# Altium schematic symbol library Resistor - Current Sense.SchLib: 810 symbols (part 4 of 4)
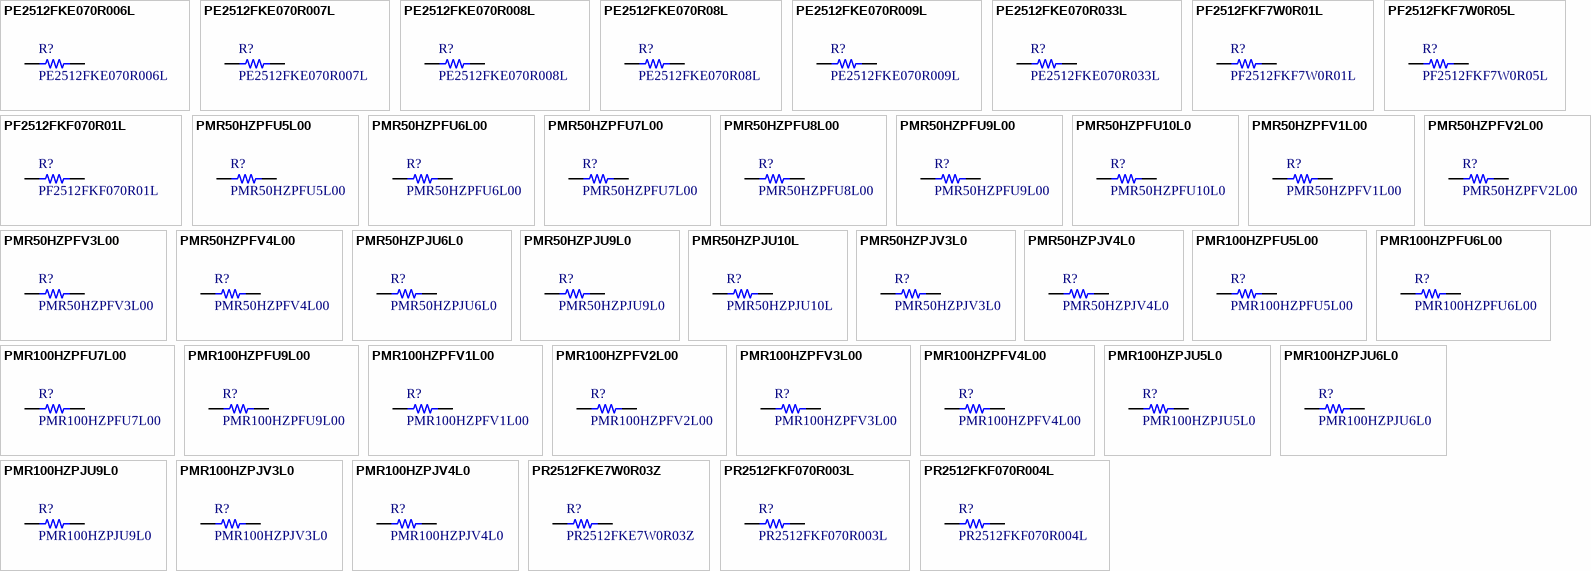
[diagram p23: symbols PE2512FKE070R006L to PR2512FKF070R004L]

## PMR50HZPFU8L00
designator R?
RES SMD 0.008 OHM 1% 1W 2010; Manufacturer: Rohm Semiconductor; Value: 0.008; TemperatureRange: -55C ~ 155C; TemperatureCoefficient: 100ppm/C; Part Number: PMR50HZPFU8L00; PartId: 21545; Supplier 1: Digi-Key; Supplier Part Number 1: RHM.008ASTR-ND; ComponentLink1Description: Datasheet; ComponentLink1URL: http://rohmfs.rohm.com/en/products/databook/datasheet/passive/resistor/chip_resistor/pmr.pdf; ComponentLink2Description: Digi-Key Listing; ComponentLink2URL: https://www.digikey.com/product-detail/en/rohm-semiconductor/PMR50HZPFU8L00/RHM.008ASTR-ND/1767323; Tolerance: 1%; PowerRating: 1W; Price: 0.1808; Device Package: 2010 (5025 Metric)
footprint STACKPOLE CSR2010
pins: 1, 2

## PMR50HZPFU9L00
designator R?
RES SMD 0.009 OHM 1% 1W 2010; Manufacturer: Rohm Semiconductor; Value: 0.009; TemperatureRange: -55C ~ 155C; TemperatureCoefficient: 100ppm/C; Part Number: PMR50HZPFU9L00; PartId: 21546; Supplier 1: Digi-Key; Supplier Part Number 1: RHM.009ASTR-ND; ComponentLink1Description: Datasheet; ComponentLink1URL: http://rohmfs.rohm.com/en/products/databook/datasheet/passive/resistor/chip_resistor/pmr.pdf; ComponentLink2Description: Digi-Key Listing; ComponentLink2URL: https://www.digikey.com/product-detail/en/rohm-semiconductor/PMR50HZPFU9L00/RHM.009ASTR-ND/1767324; Tolerance: 1%; PowerRating: 1W; Price: 0.1808; Device Package: 2010 (5025 Metric)
footprint STACKPOLE CSR2010
pins: 1, 2

## PMR50HZPFU10L0
designator R?
RES SMD 0.01 OHM 1% 1W 2010; Manufacturer: Rohm Semiconductor; Value: 0.01; TemperatureRange: -55C ~ 155C; TemperatureCoefficient: 100ppm/C; Part Number: PMR50HZPFU10L0; PartId: 21543; Supplier 1: Digi-Key; Supplier Part Number 1: RHM.010ASTR-ND; ComponentLink1Description: Datasheet; ComponentLink1URL: http://rohmfs.rohm.com/en/products/databook/datasheet/passive/resistor/chip_resistor/pmr.pdf; ComponentLink2Description: Digi-Key Listing; ComponentLink2URL: https://www.digikey.com/product-detail/en/rohm-semiconductor/PMR50HZPFU10L0/RHM.010ASTR-ND/1767325; Tolerance: 1%; PowerRating: 1W; Price: 0.1808; Device Package: 2010 (5025 Metric)
footprint STACKPOLE CSR2010
pins: 1, 2

## PMR50HZPFV1L00
designator R?
RES SMD 0.001 OHM 1% 1W 2010; Manufacturer: Rohm Semiconductor; Value: 0.001; TemperatureRange: -55C ~ 155C; TemperatureCoefficient: 100ppm/C; Part Number: PMR50HZPFV1L00; PartId: 21559; Supplier 1: Digi-Key; Supplier Part Number 1: RHM.001ASTR-ND; ComponentLink1Description: Datasheet; ComponentLink1URL: http://rohmfs.rohm.com/en/products/databook/datasheet/passive/resistor/chip_resistor/pmr.pdf; ComponentLink2Description: Digi-Key Listing; ComponentLink2URL: https://www.digikey.com/product-detail/en/rohm-semiconductor/PMR50HZPFV1L00/RHM.001ASTR-ND/1767316; Tolerance: 1%; PowerRating: 1W; Price: 0.1941; Device Package: 2010 (5025 Metric)
footprint STACKPOLE CSR2010
pins: 1, 2

## PMR50HZPFV2L00
designator R?
RES SMD 0.002 OHM 1% 1W 2010; Manufacturer: Rohm Semiconductor; Value: 0.002; TemperatureRange: -55C ~ 155C; TemperatureCoefficient: 100ppm/C; Part Number: PMR50HZPFV2L00; PartId: 21558; Supplier 1: Digi-Key; Supplier Part Number 1: RHM.002ASTR-ND; ComponentLink1Description: Datasheet; ComponentLink1URL: http://rohmfs.rohm.com/en/products/databook/datasheet/passive/resistor/chip_resistor/pmr.pdf; ComponentLink2Description: Digi-Key Listing; ComponentLink2URL: https://www.digikey.com/product-detail/en/rohm-semiconductor/PMR50HZPFV2L00/RHM.002ASTR-ND/1767317; Tolerance: 1%; PowerRating: 1W; Price: 0.1941; Device Package: 2010 (5025 Metric)
footprint STACKPOLE CSR2010
pins: 1, 2

## PMR50HZPFV3L00
designator R?
RES SMD 0.003 OHM 1% 1W 2010; Manufacturer: Rohm Semiconductor; Value: 0.003; TemperatureRange: -55C ~ 155C; TemperatureCoefficient: 100ppm/C; Part Number: PMR50HZPFV3L00; PartId: 21560; Supplier 1: Digi-Key; Supplier Part Number 1: RHM.003ASTR-ND; ComponentLink1Description: Datasheet; ComponentLink1URL: http://rohmfs.rohm.com/en/products/databook/datasheet/passive/resistor/chip_resistor/pmr.pdf; ComponentLink2Description: Digi-Key Listing; ComponentLink2URL: https://www.digikey.com/product-detail/en/rohm-semiconductor/PMR50HZPFV3L00/RHM.003ASTR-ND/1767318; Tolerance: 1%; PowerRating: 1W; Price: 0.1941; Device Package: 2010 (5025 Metric)
footprint STACKPOLE CSR2010
pins: 1, 2

## PMR50HZPFV4L00
designator R?
RES SMD 0.004 OHM 1% 1W 2010; Manufacturer: Rohm Semiconductor; Value: 0.004; TemperatureRange: -55C ~ 155C; TemperatureCoefficient: 100ppm/C; Part Number: PMR50HZPFV4L00; PartId: 21561; Supplier 1: Digi-Key; Supplier Part Number 1: RHM.004ASTR-ND; ComponentLink1Description: Datasheet; ComponentLink1URL: http://rohmfs.rohm.com/en/products/databook/datasheet/passive/resistor/chip_resistor/pmr.pdf; ComponentLink2Description: Digi-Key Listing; ComponentLink2URL: https://www.digikey.com/product-detail/en/rohm-semiconductor/PMR50HZPFV4L00/RHM.004ASTR-ND/1767319; Tolerance: 1%; PowerRating: 1W; Price: 0.1941; Device Package: 2010 (5025 Metric)
footprint STACKPOLE CSR2010
pins: 1, 2

## PMR50HZPJU6L0
designator R?
RES SMD 0.006 OHM 5% 1W 2010; Manufacturer: Rohm Semiconductor; Value: 0.006; TemperatureRange: -55C ~ 155C; TemperatureCoefficient: 100ppm/C; Part Number: PMR50HZPJU6L0; PartId: 21538; Supplier 1: Digi-Key; Supplier Part Number 1: RHM.006ATTR-ND; ComponentLink1Description: Datasheet; ComponentLink1URL: http://rohmfs.rohm.com/en/products/databook/datasheet/passive/resistor/chip_resistor/pmr.pdf; ComponentLink2Description: Digi-Key Listing; ComponentLink2URL: https://www.digikey.com/product-detail/en/rohm-semiconductor/PMR50HZPJU6L0/RHM.006ATTR-ND/1767311; Tolerance: 5%; PowerRating: 1W; Price: 0.1514; Device Package: 2010 (5025 Metric)
footprint STACKPOLE CSR2010
pins: 1, 2

## PMR50HZPJU9L0
designator R?
RES SMD 0.009 OHM 5% 1W 2010; Manufacturer: Rohm Semiconductor; Value: 0.009; TemperatureRange: -55C ~ 155C; TemperatureCoefficient: 100ppm/C; Part Number: PMR50HZPJU9L0; PartId: 21539; Supplier 1: Digi-Key; Supplier Part Number 1: RHM.009ATTR-ND; ComponentLink1Description: Datasheet; ComponentLink1URL: http://rohmfs.rohm.com/en/products/databook/datasheet/passive/resistor/chip_resistor/pmr.pdf; ComponentLink2Description: Digi-Key Listing; ComponentLink2URL: https://www.digikey.com/product-detail/en/rohm-semiconductor/PMR50HZPJU9L0/RHM.009ATTR-ND/1767314; Tolerance: 5%; PowerRating: 1W; Price: 0.1514; Device Package: 2010 (5025 Metric)
footprint STACKPOLE CSR2010
pins: 1, 2

## PMR50HZPJU10L
designator R?
RES SMD 0.01 OHM 5% 1W 2010; Manufacturer: Rohm Semiconductor; Value: 0.01; TemperatureRange: -55C ~ 155C; TemperatureCoefficient: 100ppm/C; Part Number: PMR50HZPJU10L; PartId: 21537; Supplier 1: Digi-Key; Supplier Part Number 1: RHM.010ATTR-ND; ComponentLink1Description: Datasheet; ComponentLink1URL: http://rohmfs.rohm.com/en/products/databook/datasheet/passive/resistor/chip_resistor/pmr.pdf; ComponentLink2Description: Digi-Key Listing; ComponentLink2URL: https://www.digikey.com/product-detail/en/rohm-semiconductor/PMR50HZPJU10L/RHM.010ATTR-ND/1767315; Tolerance: 5%; PowerRating: 1W; Price: 0.1514; Device Package: 2010 (5025 Metric)
footprint STACKPOLE CSR2010
pins: 1, 2

## PMR50HZPJV3L0
designator R?
RES SMD 0.003 OHM 5% 1W 2010; Manufacturer: Rohm Semiconductor; Value: 0.003; TemperatureRange: -55C ~ 155C; TemperatureCoefficient: 100ppm/C; Part Number: PMR50HZPJV3L0; PartId: 21540; Supplier 1: Digi-Key; Supplier Part Number 1: RHM.003ATTR-ND; ComponentLink1Description: Datasheet; ComponentLink1URL: http://rohmfs.rohm.com/en/products/databook/datasheet/passive/resistor/chip_resistor/pmr.pdf; ComponentLink2Description: Digi-Key Listing; ComponentLink2URL: https://www.digikey.com/product-detail/en/rohm-semiconductor/PMR50HZPJV3L0/RHM.003ATTR-ND/1767308; Tolerance: 5%; PowerRating: 1W; Price: 0.1634; Device Package: 2010 (5025 Metric)
footprint STACKPOLE CSR2010
pins: 1, 2

## PMR50HZPJV4L0
designator R?
RES SMD 0.004 OHM 5% 1W 2010; Manufacturer: Rohm Semiconductor; Value: 0.004; TemperatureRange: -55C ~ 155C; TemperatureCoefficient: 100ppm/C; Part Number: PMR50HZPJV4L0; PartId: 21541; Supplier 1: Digi-Key; Supplier Part Number 1: RHM.004ATTR-ND; ComponentLink1Description: Datasheet; ComponentLink1URL: http://rohmfs.rohm.com/en/products/databook/datasheet/passive/resistor/chip_resistor/pmr.pdf; ComponentLink2Description: Digi-Key Listing; ComponentLink2URL: https://www.digikey.com/product-detail/en/rohm-semiconductor/PMR50HZPJV4L0/RHM.004ATTR-ND/1767309; Tolerance: 5%; PowerRating: 1W; Price: 0.1634; Device Package: 2010 (5025 Metric)
footprint STACKPOLE CSR2010
pins: 1, 2

## PMR100HZPFU5L00
designator R?
RES SMD 0.005 OHM 1% 2W 2512; Manufacturer: Rohm Semiconductor; Value: 0.005; TemperatureRange: -55C ~ 155C; TemperatureCoefficient: 100ppm/C; Part Number: PMR100HZPFU5L00; PartId: 21331; Supplier 1: Digi-Key; Supplier Part Number 1: RHM.005AUTR-ND; ComponentLink1Description: Datasheet; ComponentLink1URL: http://rohmfs.rohm.com/en/products/databook/datasheet/passive/resistor/chip_resistor/pmr.pdf; ComponentLink2Description: Digi-Key Listing; ComponentLink2URL: https://www.digikey.com/product-detail/en/rohm-semiconductor/PMR100HZPFU5L00/RHM.005AUTR-ND/1767340; Tolerance: 1%; PowerRating: 2W; Price: 0.1634; Device Package: 2512 (6432 Metric)
footprint STACKPOLE CSR2512
pins: 1, 2

## PMR100HZPFU6L00
designator R?
RES SMD 0.006 OHM 1% 2W 2512; Manufacturer: Rohm Semiconductor; Value: 0.006; TemperatureRange: -55C ~ 155C; TemperatureCoefficient: 100ppm/C; Part Number: PMR100HZPFU6L00; PartId: 21332; Supplier 1: Digi-Key; Supplier Part Number 1: RHM.006AUTR-ND; ComponentLink1Description: Datasheet; ComponentLink1URL: http://rohmfs.rohm.com/en/products/databook/datasheet/passive/resistor/chip_resistor/pmr.pdf; ComponentLink2Description: Digi-Key Listing; ComponentLink2URL: https://www.digikey.com/product-detail/en/rohm-semiconductor/PMR100HZPFU6L00/RHM.006AUTR-ND/1767341; Tolerance: 1%; PowerRating: 2W; Price: 0.1634; Device Package: 2512 (6432 Metric)
footprint STACKPOLE CSR2512
pins: 1, 2

## PMR100HZPFU7L00
designator R?
RES SMD 0.007 OHM 1% 2W 2512; Manufacturer: Rohm Semiconductor; Value: 0.007; TemperatureRange: -55C ~ 155C; TemperatureCoefficient: 100ppm/C; Part Number: PMR100HZPFU7L00; PartId: 21335; Supplier 1: Digi-Key; Supplier Part Number 1: RHM.007AUTR-ND; ComponentLink1Description: Datasheet; ComponentLink1URL: http://rohmfs.rohm.com/en/products/databook/datasheet/passive/resistor/chip_resistor/pmr.pdf; ComponentLink2Description: Digi-Key Listing; ComponentLink2URL: https://www.digikey.com/product-detail/en/rohm-semiconductor/PMR100HZPFU7L00/RHM.007AUTR-ND/1767342; Tolerance: 1%; PowerRating: 2W; Price: 0.1634; Device Package: 2512 (6432 Metric)
footprint STACKPOLE CSR2512
pins: 1, 2

## PMR100HZPFU9L00
designator R?
RES SMD 0.009 OHM 1% 2W 2512; Manufacturer: Rohm Semiconductor; Value: 0.009; TemperatureRange: -55C ~ 155C; TemperatureCoefficient: 100ppm/C; Part Number: PMR100HZPFU9L00; PartId: 21336; Supplier 1: Digi-Key; Supplier Part Number 1: RHM.009AUTR-ND; ComponentLink1Description: Datasheet; ComponentLink1URL: http://rohmfs.rohm.com/en/products/databook/datasheet/passive/resistor/chip_resistor/pmr.pdf; ComponentLink2Description: Digi-Key Listing; ComponentLink2URL: https://www.digikey.com/product-detail/en/rohm-semiconductor/PMR100HZPFU9L00/RHM.009AUTR-ND/1767344; Tolerance: 1%; PowerRating: 2W; Price: 0.1634; Device Package: 2512 (6432 Metric)
footprint STACKPOLE CSR2512
pins: 1, 2

## PMR100HZPFV1L00
designator R?
RES SMD 0.001 OHM 1% 2W 2512; Manufacturer: Rohm Semiconductor; Value: 0.001; TemperatureRange: -55C ~ 155C; TemperatureCoefficient: 150ppm/C; Part Number: PMR100HZPFV1L00; PartId: 21330; Supplier 1: Digi-Key; Supplier Part Number 1: RHM.001AUTR-ND; ComponentLink1Description: Datasheet; ComponentLink1URL: http://rohmfs.rohm.com/en/products/databook/datasheet/passive/resistor/chip_resistor/pmr.pdf; ComponentLink2Description: Digi-Key Listing; ComponentLink2URL: https://www.digikey.com/product-detail/en/rohm-semiconductor/PMR100HZPFV1L00/RHM.001AUTR-ND/1767336; Tolerance: 1%; PowerRating: 2W; Price: 0.1634; Device Package: 2512 (6432 Metric)
footprint STACKPOLE CSR2512
pins: 1, 2

## PMR100HZPFV2L00
designator R?
RES SMD 0.002 OHM 1% 2W 2512; Manufacturer: Rohm Semiconductor; Value: 0.002; TemperatureRange: -55C ~ 155C; TemperatureCoefficient: 150ppm/C; Part Number: PMR100HZPFV2L00; PartId: 21333; Supplier 1: Digi-Key; Supplier Part Number 1: RHM.002AUTR-ND; ComponentLink1Description: Datasheet; ComponentLink1URL: http://rohmfs.rohm.com/en/products/databook/datasheet/passive/resistor/chip_resistor/pmr.pdf; ComponentLink2Description: Digi-Key Listing; ComponentLink2URL: https://www.digikey.com/product-detail/en/rohm-semiconductor/PMR100HZPFV2L00/RHM.002AUTR-ND/1767337; Tolerance: 1%; PowerRating: 2W; Price: 0.1634; Device Package: 2512 (6432 Metric)
footprint STACKPOLE CSR2512
pins: 1, 2

## PMR100HZPFV3L00
designator R?
RES SMD 0.003 OHM 1% 2W 2512; Manufacturer: Rohm Semiconductor; Value: 0.003; TemperatureRange: -55C ~ 155C; TemperatureCoefficient: 100ppm/C; Part Number: PMR100HZPFV3L00; PartId: 21334; Supplier 1: Digi-Key; Supplier Part Number 1: RHM.003AUTR-ND; ComponentLink1Description: Datasheet; ComponentLink1URL: http://rohmfs.rohm.com/en/products/databook/datasheet/passive/resistor/chip_resistor/pmr.pdf; ComponentLink2Description: Digi-Key Listing; ComponentLink2URL: https://www.digikey.com/product-detail/en/rohm-semiconductor/PMR100HZPFV3L00/RHM.003AUTR-ND/1767338; Tolerance: 1%; PowerRating: 2W; Price: 0.1634; Device Package: 2512 (6432 Metric)
footprint STACKPOLE CSR2512
pins: 1, 2

## PMR100HZPFV4L00
designator R?
RES SMD 0.004 OHM 1% 2W 2512; Manufacturer: Rohm Semiconductor; Value: 0.004; TemperatureRange: -55C ~ 155C; TemperatureCoefficient: 100ppm/C; Part Number: PMR100HZPFV4L00; PartId: 21337; Supplier 1: Digi-Key; Supplier Part Number 1: RHM.004AUTR-ND; ComponentLink1Description: Datasheet; ComponentLink1URL: http://rohmfs.rohm.com/en/products/databook/datasheet/passive/resistor/chip_resistor/pmr.pdf; ComponentLink2Description: Digi-Key Listing; ComponentLink2URL: https://www.digikey.com/product-detail/en/rohm-semiconductor/PMR100HZPFV4L00/RHM.004AUTR-ND/1767339; Tolerance: 1%; PowerRating: 2W; Price: 0.1634; Device Package: 2512 (6432 Metric)
footprint STACKPOLE CSR2512
pins: 1, 2

## PMR100HZPJU5L0
designator R?
RES SMD 0.005 OHM 5% 2W 2512; Manufacturer: Rohm Semiconductor; Value: 0.005; TemperatureRange: -55C ~ 155C; TemperatureCoefficient: 100ppm/C; Part Number: PMR100HZPJU5L0; PartId: 21307; Supplier 1: Digi-Key; Supplier Part Number 1: RHM.005AVTR-ND; ComponentLink1Description: Datasheet; ComponentLink1URL: http://rohmfs.rohm.com/en/products/databook/datasheet/passive/resistor/chip_resistor/pmr.pdf; ComponentLink2Description: Digi-Key Listing; ComponentLink2URL: https://www.digikey.com/product-detail/en/rohm-semiconductor/PMR100HZPJU5L0/RHM.005AVTR-ND/1767330; Tolerance: 5%; PowerRating: 2W; Price: 0.1514; Device Package: 2512 (6432 Metric)
footprint STACKPOLE CSR2512
pins: 1, 2

## PMR100HZPJU6L0
designator R?
RES SMD 0.006 OHM 5% 2W 2512; Manufacturer: Rohm Semiconductor; Value: 0.006; TemperatureRange: -55C ~ 155C; TemperatureCoefficient: 100ppm/C; Part Number: PMR100HZPJU6L0; PartId: 21308; Supplier 1: Digi-Key; Supplier Part Number 1: RHM.006AVTR-ND; ComponentLink1Description: Datasheet; ComponentLink1URL: http://rohmfs.rohm.com/en/products/databook/datasheet/passive/resistor/chip_resistor/pmr.pdf; ComponentLink2Description: Digi-Key Listing; ComponentLink2URL: https://www.digikey.com/product-detail/en/rohm-semiconductor/PMR100HZPJU6L0/RHM.006AVTR-ND/1767331; Tolerance: 5%; PowerRating: 2W; Price: 0.1514; Device Package: 2512 (6432 Metric)
footprint STACKPOLE CSR2512
pins: 1, 2

## PMR100HZPJU9L0
designator R?
RES SMD 0.009 OHM 5% 2W 2512; Manufacturer: Rohm Semiconductor; Value: 0.009; TemperatureRange: -55C ~ 155C; TemperatureCoefficient: 100ppm/C; Part Number: PMR100HZPJU9L0; PartId: 21309; Supplier 1: Digi-Key; Supplier Part Number 1: RHM.009AVTR-ND; ComponentLink1Description: Datasheet; ComponentLink1URL: http://rohmfs.rohm.com/en/products/databook/datasheet/passive/resistor/chip_resistor/pmr.pdf; ComponentLink2Description: Digi-Key Listing; ComponentLink2URL: https://www.digikey.com/product-detail/en/rohm-semiconductor/PMR100HZPJU9L0/RHM.009AVTR-ND/1767334; Tolerance: 5%; PowerRating: 2W; Price: 0.1514; Device Package: 2512 (6432 Metric)
footprint STACKPOLE CSR2512
pins: 1, 2

## PMR100HZPJV3L0
designator R?
RES SMD 0.003 OHM 5% 2W 2512; Manufacturer: Rohm Semiconductor; Value: 0.003; TemperatureRange: -55C ~ 155C; TemperatureCoefficient: 100ppm/C; Part Number: PMR100HZPJV3L0; PartId: 21391; Supplier 1: Digi-Key; Supplier Part Number 1: RHM.003AVTR-ND; ComponentLink1Description: Datasheet; ComponentLink1URL: http://rohmfs.rohm.com/en/products/databook/datasheet/passive/resistor/chip_resistor/pmr.pdf; ComponentLink2Description: Digi-Key Listing; ComponentLink2URL: https://www.digikey.com/product-detail/en/rohm-semiconductor/PMR100HZPJV3L0/RHM.003AVTR-ND/1767328; Tolerance: 5%; PowerRating: 2W; Price: 0.1782; Device Package: 2512 (6432 Metric)
footprint STACKPOLE CSR2512
pins: 1, 2

## PMR100HZPJV4L0
designator R?
RES SMD 0.004 OHM 5% 2W 2512; Manufacturer: Rohm Semiconductor; Value: 0.004; TemperatureRange: -55C ~ 155C; TemperatureCoefficient: 100ppm/C; Part Number: PMR100HZPJV4L0; PartId: 21392; Supplier 1: Digi-Key; Supplier Part Number 1: RHM.004AVTR-ND; ComponentLink1Description: Datasheet; ComponentLink1URL: http://rohmfs.rohm.com/en/products/databook/datasheet/passive/resistor/chip_resistor/pmr.pdf; ComponentLink2Description: Digi-Key Listing; ComponentLink2URL: https://www.digikey.com/product-detail/en/rohm-semiconductor/PMR100HZPJV4L0/RHM.004AVTR-ND/1767329; Tolerance: 5%; PowerRating: 2W; Price: 0.1782; Device Package: 2512 (6432 Metric)
footprint STACKPOLE CSR2512
pins: 1, 2

## PR2512FKE7W0R03Z
designator R?
RES SMD 0.03 OHM 1% 2W 2512; Manufacturer: Yageo; Value: 0.03; TemperatureRange: -55C ~ 170C; TemperatureCoefficient: 50ppm/C; Part Number: PR2512FKE7W0R03Z; PartId: 21440; Supplier 1: Digi-Key; Supplier Part Number 1: 311-0.03PDTR-ND; ComponentLink1Description: Datasheet; ComponentLink1URL: http://www.yageo.com/NewPortal/yageodocoutput?fileName=/pdf/R-Chip/-PYu-PR_51_RoHS_Z_0.pdf; ComponentLink2Description: Digi-Key Listing; ComponentLink2URL: https://www.digikey.com/product-detail/en/yageo/PR2512FKE7W0R03Z/311-0.03PDTR-ND/2827693; Tolerance: 1%; PowerRating: 2W; Price: 0.272; Device Package: 2512 (6432 Metric)
footprint STACKPOLE CSR2512
pins: 1, 2

## PR2512FKF070R003L
designator R?
RES SMD 0.003 OHM 1% 1W 2512; Manufacturer: Yageo; Value: 0.003; TemperatureRange: -55C ~ 170C; TemperatureCoefficient: 100ppm/C; Part Number: PR2512FKF070R003L; PartId: 21401; Supplier 1: Digi-Key; Supplier Part Number 1: 311-0.003AGTR-ND; ComponentLink1Description: Datasheet; ComponentLink1URL: http://www.yageo.com/NewPortal/yageodocoutput?fileName=/pdf/R-Chip/-PYu-PR_51_RoHS_Z_0.pdf; ComponentLink2Description: Digi-Key Listing; ComponentLink2URL: https://www.digikey.com/product-detail/en/yageo/PR2512FKF070R003L/311-0.003AGTR-ND/2178317; Tolerance: 1%; PowerRating: 1W; Price: 0.1882; Device Package: 2512 (6432 Metric)
footprint STACKPOLE CSR2512
pins: 1, 2

## PR2512FKF070R004L
designator R?
RES SMD 0.004 OHM 1% 1W 2512; Manufacturer: Yageo; Value: 0.004; TemperatureRange: -55C ~ 170C; TemperatureCoefficient: 100ppm/C; Part Number: PR2512FKF070R004L; PartId: 21403; Supplier 1: Digi-Key; Supplier Part Number 1: 311-0.004AGTR-ND; ComponentLink1Description: Datasheet; ComponentLink1URL: http://www.yageo.com/NewPortal/yageodocoutput?fileName=/pdf/R-Chip/-PYu-PR_51_RoHS_Z_0.pdf; ComponentLink2Description: Digi-Key Listing; ComponentLink2URL: https://www.digikey.com/product-detail/en/yageo/PR2512FKF070R004L/311-0.004AGTR-ND/2178316; Tolerance: 1%; PowerRating: 1W; Price: 0.1882; Device Package: 2512 (6432 Metric)
footprint STACKPOLE CSR2512
pins: 1, 2

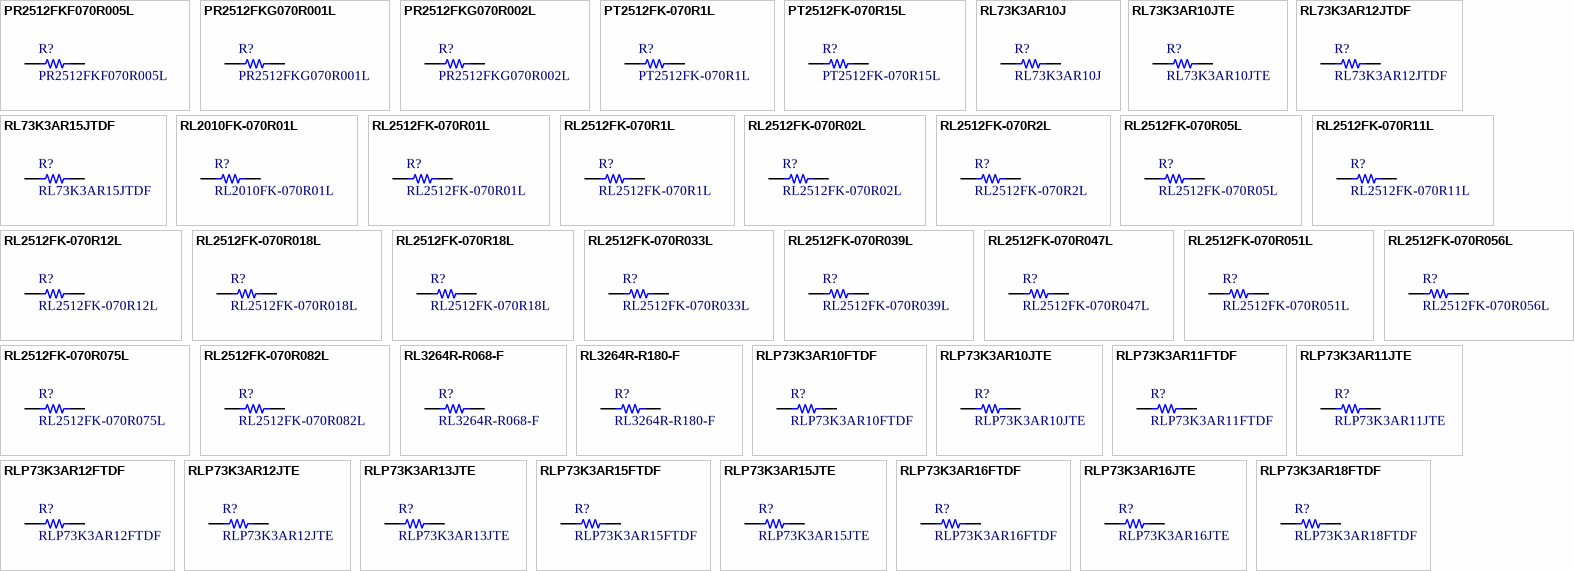
[diagram p16: symbols PR2512FKF070R005L to RLP73K3AR18FTDF]

## PR2512FKF070R005L
designator R?
RES SMD 0.005 OHM 1% 1W 2512; Manufacturer: Yageo; Value: 0.005; TemperatureRange: -55C ~ 170C; TemperatureCoefficient: 100ppm/C; Part Number: PR2512FKF070R005L; PartId: 21402; Supplier 1: Digi-Key; Supplier Part Number 1: 311-0.005AGTR-ND; ComponentLink1Description: Datasheet; ComponentLink1URL: http://www.yageo.com/NewPortal/yageodocoutput?fileName=/pdf/R-Chip/-PYu-PR_51_RoHS_Z_0.pdf; ComponentLink2Description: Digi-Key Listing; ComponentLink2URL: https://www.digikey.com/product-detail/en/yageo/PR2512FKF070R005L/311-0.005AGTR-ND/2178315; Tolerance: 1%; PowerRating: 1W; Price: 0.1882; Device Package: 2512 (6432 Metric)
footprint STACKPOLE CSR2512
pins: 1, 2

## PR2512FKG070R001L
designator R?
RES SMD 0.001 OHM 1% 1W 2512; Manufacturer: Yageo; Value: 0.001; TemperatureRange: -55C ~ 170C; TemperatureCoefficient: 200ppm/C; Part Number: PR2512FKG070R001L; PartId: 21438; Supplier 1: Digi-Key; Supplier Part Number 1: 311-0.001AGTR-ND; ComponentLink1Description: Datasheet; ComponentLink1URL: http://www.yageo.com/NewPortal/yageodocoutput?fileName=/pdf/R-Chip/-PYu-PR_51_RoHS_Z_0.pdf; ComponentLink2Description: Digi-Key Listing; ComponentLink2URL: https://www.digikey.com/product-detail/en/yageo/PR2512FKG070R001L/311-0.001AGTR-ND/2178319; Tolerance: 1%; PowerRating: 1W; Price: 0.272; Device Package: 2512 (6432 Metric)
footprint STACKPOLE CSR2512
pins: 1, 2

## PR2512FKG070R002L
designator R?
RES SMD 0.002 OHM 1% 1W 2512; Manufacturer: Yageo; Value: 0.002; TemperatureRange: -55C ~ 170C; TemperatureCoefficient: 200ppm/C; Part Number: PR2512FKG070R002L; PartId: 21439; Supplier 1: Digi-Key; Supplier Part Number 1: 311-0.002AGTR-ND; ComponentLink1Description: Datasheet; ComponentLink1URL: http://www.yageo.com/NewPortal/yageodocoutput?fileName=/pdf/R-Chip/-PYu-PR_51_RoHS_Z_0.pdf; ComponentLink2Description: Digi-Key Listing; ComponentLink2URL: https://www.digikey.com/product-detail/en/yageo/PR2512FKG070R002L/311-0.002AGTR-ND/2178318; Tolerance: 1%; PowerRating: 1W; Price: 0.272; Device Package: 2512 (6432 Metric)
footprint STACKPOLE CSR2512
pins: 1, 2

## PT2512FK-070R1L
designator R?
RES SMD 0.1 OHM 1% 1W 2512; Manufacturer: Yageo; Value: 0.1; TemperatureRange: -55C ~ 155C; TemperatureCoefficient: 100ppm/C; Part Number: PT2512FK-070R1L; PartId: 21227; Supplier 1: Digi-Key; Supplier Part Number 1: 311-0.1ARTR-ND; ComponentLink1Description: Datasheet; ComponentLink1URL: http://www.yageo.com/documents/recent/PYu-PT-Group_521_RoHS_L-1.pdf; ComponentLink2Description: Digi-Key Listing; ComponentLink2URL: https://www.digikey.com/product-detail/en/yageo/PT2512FK-070R1L/311-0.1ARTR-ND/2178346; Tolerance: 1%; PowerRating: 1W; Price: 0.1004; Device Package: 2512 (6432 Metric)
footprint STACKPOLE CSR2512
pins: 1, 2

## PT2512FK-070R15L
designator R?
RES SMD 0.15 OHM 1% 1W 2512; Manufacturer: Yageo; Value: 0.15; TemperatureRange: -55C ~ 155C; TemperatureCoefficient: 75ppm/C; Part Number: PT2512FK-070R15L; PartId: 21217; Supplier 1: Digi-Key; Supplier Part Number 1: 311-0.15ARTR-ND; ComponentLink1Description: Datasheet; ComponentLink1URL: http://www.yageo.com/documents/recent/PYu-PT-Group_521_RoHS_L-1.pdf; ComponentLink2Description: Digi-Key Listing; ComponentLink2URL: https://www.digikey.com/product-detail/en/yageo/PT2512FK-070R15L/311-0.15ARTR-ND/2178347; Tolerance: 1%; PowerRating: 1W; Price: 0.096; Device Package: 2512 (6432 Metric)
footprint STACKPOLE CSR2512
pins: 1, 2

## RL73K3AR10J
designator R?
RES SMD 0.1 OHM 5% 1W 2512; Value: 0.1; TemperatureRange: -55C ~ 155C; TemperatureCoefficient: 200ppm/C; Part Number: RL73K3AR10J; PartId: 21212; Supplier 1: Digi-Key; Supplier Part Number 1: A103652TR-ND; ComponentLink1Description: Datasheet; ComponentLink1URL: http://www.te.com/commerce/DocumentDelivery/DDEController?Action=srchrtrv&DocNm=1773269&DocType=DS&DocLang=English; ComponentLink2Description: Digi-Key Listing; ComponentLink2URL: https://www.digikey.com/product-detail/en/te-connectivity-passive-product/RL73K3AR10J/A103652TR-ND/2055681; Tolerance: 5%; PowerRating: 1W; Price: 0.0813; Device Package: 2512 (6432 Metric)
footprint STACKPOLE CSR2512
pins: 1, 2

## RL73K3AR10JTE
designator R?
RES SMD 0.1 OHM 5% 1W 2512; Value: 0.1; TemperatureRange: -55C ~ 155C; TemperatureCoefficient: 200ppm/C; Part Number: RL73K3AR10JTE; PartId: 21211; Supplier 1: Digi-Key; Supplier Part Number 1: A103653TR-ND; ComponentLink1Description: Datasheet; ComponentLink1URL: http://www.te.com/commerce/DocumentDelivery/DDEController?Action=srchrtrv&DocNm=1773269&DocType=DS&DocLang=English; ComponentLink2Description: Digi-Key Listing; ComponentLink2URL: https://www.digikey.com/product-detail/en/te-connectivity-passive-product/RL73K3AR10JTE/A103653TR-ND/2055682; Tolerance: 5%; PowerRating: 1W; Price: 0.0813; Device Package: 2512 (6432 Metric)
footprint STACKPOLE CSR2512
pins: 1, 2

## RL73K3AR12JTDF
designator R?
RES SMD 0.12 OHM 5% 1W 2512; Value: 0.12; TemperatureRange: -55C ~ 155C; TemperatureCoefficient: 200ppm/C; Part Number: RL73K3AR12JTDF; PartId: 21241; Supplier 1: Digi-Key; Supplier Part Number 1: A106123TR-ND; ComponentLink1Description: Datasheet; ComponentLink1URL: http://www.te.com/commerce/DocumentDelivery/DDEController?Action=srchrtrv&DocNm=1773269&DocType=DS&DocLang=English; ComponentLink2Description: Digi-Key Listing; ComponentLink2URL: https://www.digikey.com/product-detail/en/te-connectivity-passive-product/RL73K3AR12JTDF/A106123TR-ND/2364959; Tolerance: 5%; PowerRating: 1W; Price: 0.1111; Device Package: 2512 (6432 Metric)
footprint STACKPOLE CSR2512
pins: 1, 2

## RL73K3AR15JTDF
designator R?
RES SMD 0.15 OHM 5% 1W 2512; Value: 0.15; TemperatureRange: -55C ~ 155C; TemperatureCoefficient: 200ppm/C; Part Number: RL73K3AR15JTDF; PartId: 21240; Supplier 1: Digi-Key; Supplier Part Number 1: A106124TR-ND; ComponentLink1Description: Datasheet; ComponentLink1URL: http://www.te.com/commerce/DocumentDelivery/DDEController?Action=srchrtrv&DocNm=1773269&DocType=DS&DocLang=English; ComponentLink2Description: Digi-Key Listing; ComponentLink2URL: https://www.digikey.com/product-detail/en/te-connectivity-passive-product/RL73K3AR15JTDF/A106124TR-ND/2364960; Tolerance: 5%; PowerRating: 1W; Price: 0.1111; Device Package: 2512 (6432 Metric)
footprint STACKPOLE CSR2512
pins: 1, 2

## RL2010FK-070R01L
designator R?
RES SMD 0.01 OHM 1% 3/4W 2010; Manufacturer: Yageo; Value: 0.01; TemperatureRange: -55C ~ 155C; TemperatureCoefficient: 1500ppm/C; PowerRating: 0.75W, 3/4W; Part Number: RL2010FK-070R01L; PartId: 21532; Supplier 1: Digi-Key; Supplier Part Number 1: 311-0.01PKTR-ND; ComponentLink1Description: Datasheet; ComponentLink1URL: http://www.yageo.com/documents/recent/PYu-RL_Group_521_RoHS_L%201.pdf; ComponentLink2Description: Digi-Key Listing; ComponentLink2URL: https://www.digikey.com/product-detail/en/yageo/RL2010FK-070R01L/311-0.01PKTR-ND/3885965; Tolerance: 1%; Price: 0.1229; Device Package: 2010 (5125 Metric)
footprint STACKPOLE CSR2010
pins: 1, 2

## RL2512FK-070R01L
designator R?
RES SMD 0.01 OHM 1% 1W 2512; Manufacturer: Yageo; Value: 0.01; TemperatureRange: -55C ~ 155C; TemperatureCoefficient: 1500ppm/C; Part Number: RL2512FK-070R01L; PartId: 21263; Supplier 1: Digi-Key; Supplier Part Number 1: 311-.010TTR-ND; ComponentLink1Description: Datasheet; ComponentLink1URL: http://www.yageo.com/documents/recent/PYu-RL_Group_521_RoHS_L%201.pdf; ComponentLink2Description: Digi-Key Listing; ComponentLink2URL: https://www.digikey.com/product-detail/en/yageo/RL2512FK-070R01L/311-.010TTR-ND/1037140; Tolerance: 1%; PowerRating: 1W; Price: 0.1309; Device Package: 2512 (6432 Metric)
footprint STACKPOLE CSR2512
pins: 1, 2

## RL2512FK-070R1L
designator R?
RES SMD 0.1 OHM 1% 1W 2512; Manufacturer: Yageo; Value: 0.1; TemperatureRange: -55C ~ 155C; TemperatureCoefficient: 600ppm/C; Part Number: RL2512FK-070R1L; PartId: 21218; Supplier 1: Digi-Key; Supplier Part Number 1: 311-0.1TTR-ND; ComponentLink1Description: Datasheet; ComponentLink1URL: http://www.yageo.com/documents/recent/PYu-RL_Group_521_RoHS_L%201.pdf; ComponentLink2Description: Digi-Key Listing; ComponentLink2URL: https://www.digikey.com/product-detail/en/yageo/RL2512FK-070R1L/311-0.1TTR-ND/2827664; Tolerance: 1%; PowerRating: 1W; Price: 0.097; Device Package: 2512 (6432 Metric)
footprint STACKPOLE CSR2512
pins: 1, 2

## RL2512FK-070R02L
designator R?
RES SMD 0.02 OHM 1% 1W 2512; Manufacturer: Yageo; Value: 0.02; TemperatureRange: -55C ~ 155C; TemperatureCoefficient: 1200ppm/C; Part Number: RL2512FK-070R02L; PartId: 21267; Supplier 1: Digi-Key; Supplier Part Number 1: 311-0.02TTR-ND; ComponentLink1Description: Datasheet; ComponentLink1URL: http://www.yageo.com/documents/recent/PYu-RL_Group_521_RoHS_L%201.pdf; ComponentLink2Description: Digi-Key Listing; ComponentLink2URL: https://www.digikey.com/product-detail/en/yageo/RL2512FK-070R02L/311-0.02TTR-ND/2827671; Tolerance: 1%; PowerRating: 1W; Price: 0.1309; Device Package: 2512 (6432 Metric)
footprint STACKPOLE CSR2512
pins: 1, 2

## RL2512FK-070R2L
designator R?
RES SMD 0.2 OHM 1% 1W 2512; Manufacturer: Yageo; Value: 0.2; TemperatureRange: -55C ~ 155C; TemperatureCoefficient: 600ppm/C; Part Number: RL2512FK-070R2L; PartId: 21219; Supplier 1: Digi-Key; Supplier Part Number 1: 311-0.2TTR-ND; ComponentLink1Description: Datasheet; ComponentLink1URL: http://www.yageo.com/documents/recent/PYu-RL_Group_521_RoHS_L%201.pdf; ComponentLink2Description: Digi-Key Listing; ComponentLink2URL: https://www.digikey.com/product-detail/en/yageo/RL2512FK-070R2L/311-0.2TTR-ND/3885935; Tolerance: 1%; PowerRating: 1W; Price: 0.097; Device Package: 2512 (6432 Metric)
footprint STACKPOLE CSR2512
pins: 1, 2

## RL2512FK-070R05L
designator R?
RES SMD 0.05 OHM 1% 1W 2512; Manufacturer: Yageo; Value: 0.05; TemperatureRange: -55C ~ 155C; TemperatureCoefficient: 800ppm/C; Part Number: RL2512FK-070R05L; PartId: 21268; Supplier 1: Digi-Key; Supplier Part Number 1: 311-0.05TTR-ND; ComponentLink1Description: Datasheet; ComponentLink1URL: http://www.yageo.com/documents/recent/PYu-RL_Group_521_RoHS_L%201.pdf; ComponentLink2Description: Digi-Key Listing; ComponentLink2URL: https://www.digikey.com/product-detail/en/yageo/RL2512FK-070R05L/311-0.05TTR-ND/3885862; Tolerance: 1%; PowerRating: 1W; Price: 0.1309; Device Package: 2512 (6432 Metric)
footprint STACKPOLE CSR2512
pins: 1, 2

## RL2512FK-070R11L
designator R?
RES SMD 0.11 OHM 1% 1W 2512; Manufacturer: Yageo; Value: 0.11; TemperatureRange: -55C ~ 155C; TemperatureCoefficient: 600ppm/C; Part Number: RL2512FK-070R11L; PartId: 21220; Supplier 1: Digi-Key; Supplier Part Number 1: 311-0.11TTR-ND; ComponentLink1Description: Datasheet; ComponentLink1URL: http://www.yageo.com/documents/recent/PYu-RL_Group_521_RoHS_L%201.pdf; ComponentLink2Description: Digi-Key Listing; ComponentLink2URL: https://www.digikey.com/product-detail/en/yageo/RL2512FK-070R11L/311-0.11TTR-ND/3885863; Tolerance: 1%; PowerRating: 1W; Price: 0.097; Device Package: 2512 (6432 Metric)
footprint STACKPOLE CSR2512
pins: 1, 2

## RL2512FK-070R12L
designator R?
RES SMD 0.12 OHM 1% 1W 2512; Manufacturer: Yageo; Value: 0.12; TemperatureRange: -55C ~ 155C; TemperatureCoefficient: 600ppm/C; Part Number: RL2512FK-070R12L; PartId: 21221; Supplier 1: Digi-Key; Supplier Part Number 1: 311-0.12TTR-ND; ComponentLink1Description: Datasheet; ComponentLink1URL: http://www.yageo.com/documents/recent/PYu-RL_Group_521_RoHS_L%201.pdf; ComponentLink2Description: Digi-Key Listing; ComponentLink2URL: https://www.digikey.com/product-detail/en/yageo/RL2512FK-070R12L/311-0.12TTR-ND/3885855; Tolerance: 1%; PowerRating: 1W; Price: 0.097; Device Package: 2512 (6432 Metric)
footprint STACKPOLE CSR2512
pins: 1, 2

## RL2512FK-070R018L
designator R?
RES SMD 0.018 OHM 1% 1W 2512; Manufacturer: Yageo; Value: 0.018; TemperatureRange: -55C ~ 155C; TemperatureCoefficient: 1500ppm/C; Part Number: RL2512FK-070R018L; PartId: 21266; Supplier 1: Digi-Key; Supplier Part Number 1: 311-.018TTR-ND; ComponentLink1Description: Datasheet; ComponentLink1URL: http://www.yageo.com/documents/recent/PYu-RL_Group_521_RoHS_L%201.pdf; ComponentLink2Description: Digi-Key Listing; ComponentLink2URL: https://www.digikey.com/product-detail/en/yageo/RL2512FK-070R018L/311-.018TTR-ND/1037139; Tolerance: 1%; PowerRating: 1W; Price: 0.1309; Device Package: 2512 (6432 Metric)
footprint STACKPOLE CSR2512
pins: 1, 2

## RL2512FK-070R18L
designator R?
RES SMD 0.18 OHM 1% 1W 2512; Manufacturer: Yageo; Value: 0.18; TemperatureRange: -55C ~ 155C; TemperatureCoefficient: 600ppm/C; Part Number: RL2512FK-070R18L; PartId: 21222; Supplier 1: Digi-Key; Supplier Part Number 1: 311-0.18TTR-ND; ComponentLink1Description: Datasheet; ComponentLink1URL: http://www.yageo.com/documents/recent/PYu-RL_Group_521_RoHS_L%201.pdf; ComponentLink2Description: Digi-Key Listing; ComponentLink2URL: https://www.digikey.com/product-detail/en/yageo/RL2512FK-070R18L/311-0.18TTR-ND/3885859; Tolerance: 1%; PowerRating: 1W; Price: 0.097; Device Package: 2512 (6432 Metric)
footprint STACKPOLE CSR2512
pins: 1, 2

## RL2512FK-070R033L
designator R?
RES SMD 0.033 OHM 1% 1W 2512; Manufacturer: Yageo; Value: 0.033; TemperatureRange: -55C ~ 155C; TemperatureCoefficient: 1200ppm/C; Part Number: RL2512FK-070R033L; PartId: 21265; Supplier 1: Digi-Key; Supplier Part Number 1: 311-.033TTR-ND; ComponentLink1Description: Datasheet; ComponentLink1URL: http://www.yageo.com/documents/recent/PYu-RL_Group_521_RoHS_L%201.pdf; ComponentLink2Description: Digi-Key Listing; ComponentLink2URL: https://www.digikey.com/product-detail/en/yageo/RL2512FK-070R033L/311-.033TTR-ND/1037143; Tolerance: 1%; PowerRating: 1W; Price: 0.1309; Device Package: 2512 (6432 Metric)
footprint STACKPOLE CSR2512
pins: 1, 2

## RL2512FK-070R039L
designator R?